# Altium schematic symbol library FPGA_Xilinx_Virtex7.SchLib: 34 symbols (part 10 of 34)
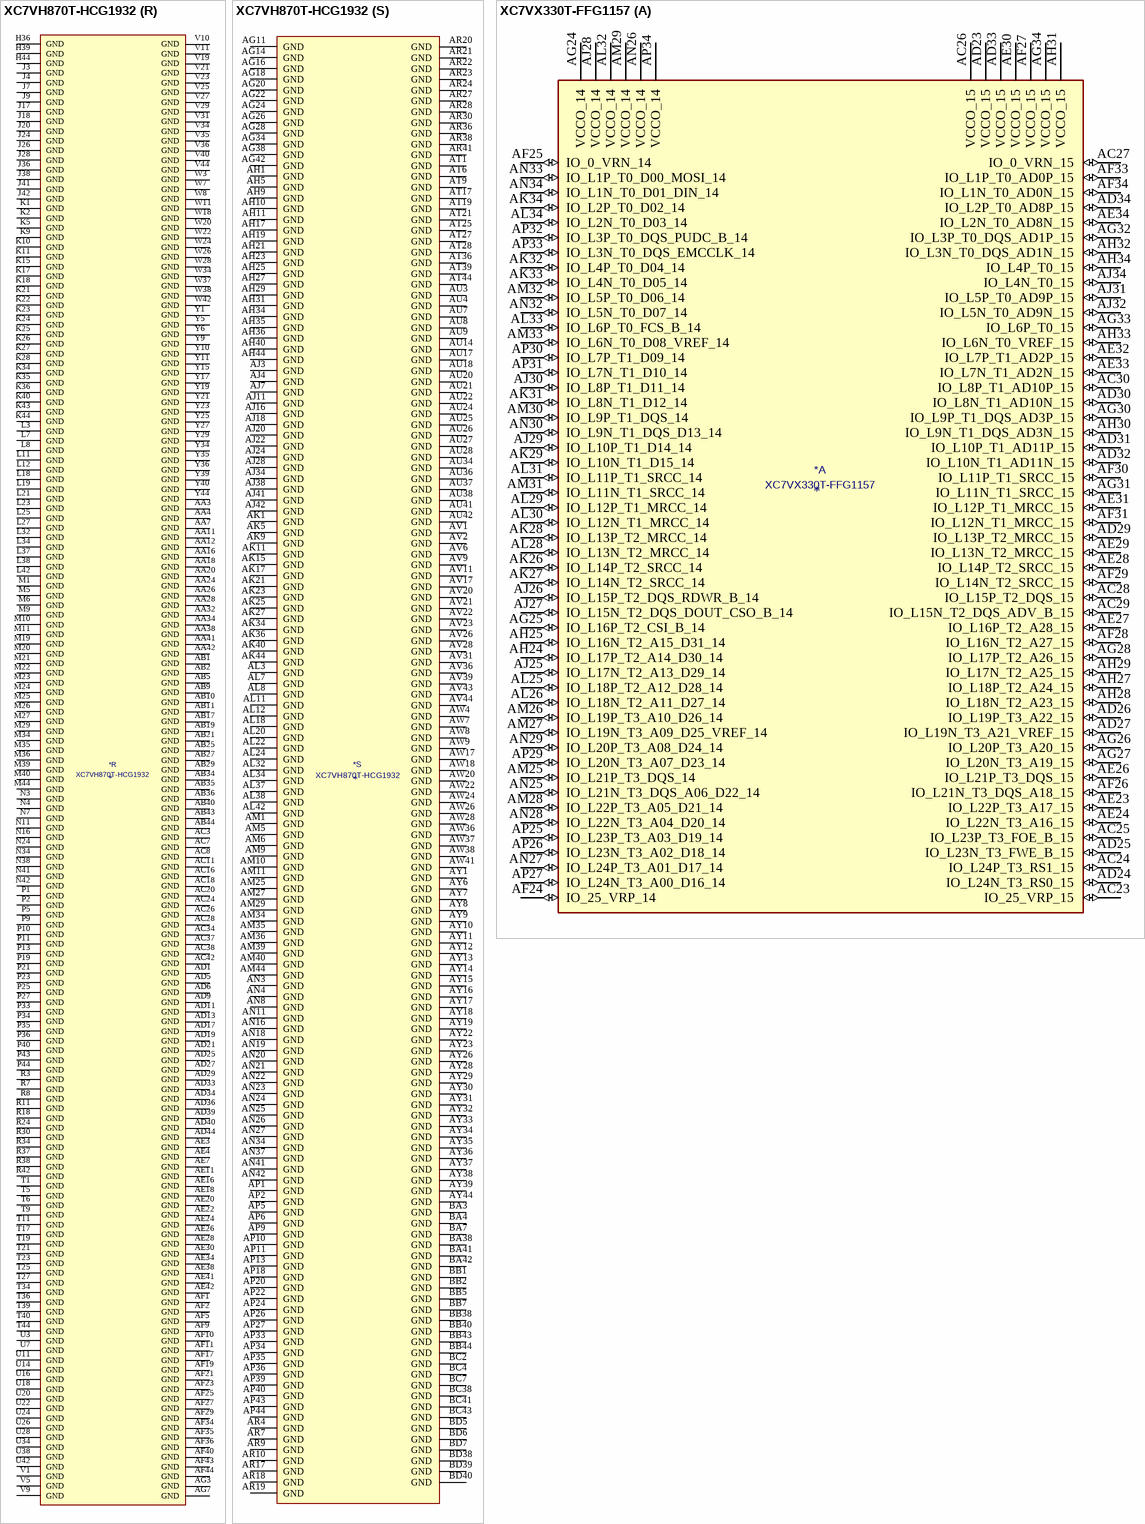
[diagram p181: symbols XC7VH870T-HCG1932 to XC7VX330T-FFG1157]

## XC7VH870T-HCG1932
designator *  value XC7VH870T-HCG1932
ki_keywords: FPGA; ki_description: Virtex 7 HT 870 XC7VH870T-FLG1932
part A pins: AA30 IO_L11P_T1_SRCC_14 (io), AA31 IO_L11N_T1_SRCC_14 (io), AA33 IO_L7P_T1_D09_14 (io), AB30 IO_L12P_T1_MRCC_14 (io), AB31 IO_L12N_T1_MRCC_14 (io), AB32 IO_L9P_T1_DQS_14 (io), AB33 IO_L9N_T1_DQS_D13_14 (io), AC30 IO_L13P_T2_MRCC_14 (io), AC31 VCCO_14 (power), AC32 IO_L17P_T2_A14_D30_14 (io), AC33 IO_L17N_T2_A13_D29_14 (io), AD30 IO_L13N_T2_MRCC_14 (io), AD31 IO_L14P_T2_SRCC_14 (io), AD32 IO_L14N_T2_SRCC_14 (io), AE31 IO_L16P_T2_CSI_B_14 (io), AE32 IO_L16N_T2_A15_D31_14 (io), AE33 IO_L18P_T2_A12_D28_14 (io), AF30 IO_L15P_T2_DQS_RDWR_B_14 (io), AF31 IO_L15N_T2_DQS_DOUT_CSO_B_14 (io), AF32 VCCO_14 (power), AF33 IO_L18N_T2_A11_D27_14 (io), AG30 IO_L20P_T3_A08_D24_14 (io), AG31 IO_L20N_T3_A07_D23_14 (io), AG32 IO_L19P_T3_A10_D26_14 (io), AG33 IO_L19N_T3_A09_D25_VREF_14 (io), AH30 IO_L23P_T3_A03_D19_14 (io), AH32 IO_L24P_T3_A01_D17_14 (io), AH33 IO_L24N_T3_A00_D16_14 (io), AJ29 IO_25_VRP_14 (io), AJ30 IO_L23N_T3_A02_D18_14 (io), AJ31 IO_L21P_T3_DQS_14 (io), AJ32 IO_L21N_T3_DQS_A06_D22_14 (io), AJ33 VCCO_14 (power), AK28 IO_L16P_T2_13 (io), AK29 IO_L18P_T2_13 (io), AK30 VCCO_13 (power), AK31 IO_L3P_T0_DQS_13 (io), AK32 IO_L22P_T3_A05_D21_14 (io), AK33 IO_L22N_T3_A04_D20_14 (io), AL28 IO_L16N_T2_13 (io), AL29 IO_L18N_T2_13 (io), AL30 IO_L15P_T2_DQS_13 (io), AL31 IO_L3N_T0_DQS_13 (io), AL33 IO_L1P_T0_13 (io), AM28 IO_L17P_T2_13 (io), AM30 IO_L15N_T2_DQS_13 (io), AM31 IO_L5P_T0_13 (io), AM32 IO_L5N_T0_13 (io), AM33 IO_L1N_T0_13 (io), AN28 IO_L17N_T2_13 (io), AN29 IO_L14P_T2_SRCC_13 (io), AN30 IO_L14N_T2_SRCC_13 (io), AN31 VCCO_13 (power), AN32 IO_L4P_T0_13 (io), AN33 IO_L4N_T0_13 (io), AP28 VCCO_13 (power), AP29 IO_L13P_T2_MRCC_13 (io), AP30 IO_L13N_T2_MRCC_13 (io), AP31 IO_L11P_T1_SRCC_13 (io), AP32 IO_L6P_T0_13 (io), AR29 IO_L20P_T3_13 (io), AR31 IO_L11N_T1_SRCC_13 (io), AR32 IO_L6N_T0_VREF_13 (io), AR33 IO_L2P_T0_13 (io), AR34 IO_L2N_T0_13 (io), AR35 VCCO_13 (power), AT29 IO_L20N_T3_13 (io), AT30 IO_L24P_T3_13 (io), AT31 IO_L12P_T1_MRCC_13 (io), AT32 VCCO_13 (power), AT33 IO_L9P_T1_DQS_13 (io), AT34 IO_L9N_T1_DQS_13 (io), AT35 IO_L8P_T1_13 (io), AU29 VCCO_13 (power), AU30 IO_L24N_T3_13 (io), AU31 IO_L12N_T1_MRCC_13 (io), AU32 IO_L7P_T1_13 (io), AU33 IO_L7N_T1_13 (io), AU35 IO_L8N_T1_13 (io), AV29 IO_L22P_T3_13 (io), AV30 IO_L22N_T3_13 (io), AV32 IO_L19P_T3_13 (io), AV33 IO_L21P_T3_DQS_13 (io), AV34 IO_L21N_T3_DQS_13 (io), AV35 IO_L10P_T1_13 (io), AW29 IO_25_VRP_13 (io), AW30 IO_L23P_T3_13 (io), AW31 IO_L23N_T3_13 (io), AW32 IO_L19N_T3_VREF_13 (io), AW33 VCCO_13 (power), AW34 IO_0_VRN_13 (io), AW35 IO_L10N_T1_13 (io), R33 IO_L1N_T0_D01_DIN_14 (io), T29 IO_0_VRN_14 (io), T30 IO_L4N_T0_D05_14 (io), T31 IO_L2N_T0_D03_14 (io), T32 VCCO_14 (power), T33 IO_L1P_T0_D00_MOSI_14 (io), U30 IO_L4P_T0_D04_14 (io), U31 IO_L2P_T0_D02_14 (io), U32 IO_L6N_T0_D08_VREF_14 (io), U33 IO_L5N_T0_D07_14 (io), V30 IO_L3N_T0_DQS_EMCCLK_14 (io), V32 IO_L6P_T0_FCS_B_14 (io), V33 IO_L5P_T0_D06_14 (io), W30 IO_L3P_T0_DQS_PUDC_B_14 (io), W31 IO_L8N_T1_D12_14 (io), W32 IO_L10N_T1_D15_14 (io), W33 VCCO_14 (power), Y30 VCCO_14 (power), Y31 IO_L8P_T1_D11_14 (io), Y32 IO_L10P_T1_D14_14 (io), Y33 IO_L7N_T1_D10_14 (io)
part B pins: AK13 IO_L1P_T0_33 (io), AK14 IO_L3P_T0_DQS_33 (io), AK16 IO_L18P_T2_33 (io), AL13 IO_L1N_T0_33 (io), AL14 IO_L3N_T0_DQS_33 (io), AL15 IO_L15P_T2_DQS_33 (io), AL16 IO_L18N_T2_33 (io), AL17 VCCO_33 (power), AM12 IO_L5N_T0_33 (io), AM13 IO_L5P_T0_33 (io), AM14 VCCO_33 (power), AM15 IO_L15N_T2_DQS_33 (io), AM16 IO_L16N_T2_33 (io), AM17 IO_L16P_T2_33 (io), AN12 IO_L4N_T0_33 (io), AN13 IO_L4P_T0_33 (io), AN14 IO_L14N_T2_SRCC_33 (io), AN15 IO_L14P_T2_SRCC_33 (io), AN17 IO_L17P_T2_33 (io), AP12 IO_L6N_T0_VREF_33 (io), AP14 IO_L11P_T1_SRCC_33 (io), AP15 IO_L13N_T2_MRCC_33 (io), AP16 IO_L13P_T2_MRCC_33 (io), AP17 IO_L17N_T2_33 (io), AR11 IO_L2N_T0_33 (io), AR12 IO_L2P_T0_33 (io), AR13 IO_L6P_T0_33 (io), AR14 IO_L11N_T1_SRCC_33 (io), AR15 VCCO_33 (power), AR16 IO_L20P_T3_33 (io), AT10 IO_L8P_T1_33 (io), AT11 IO_L9P_T1_DQS_33 (io), AT12 VCCO_33 (power), AT13 IO_L12N_T1_MRCC_33 (io), AT14 IO_L12P_T1_MRCC_33 (io), AT15 IO_L24P_T3_33 (io), AT16 IO_L20N_T3_33 (io), AU10 IO_L8N_T1_33 (io), AU11 IO_L9N_T1_DQS_33 (io), AU12 IO_L7N_T1_33 (io), AU13 IO_L7P_T1_33 (io), AU15 IO_L24N_T3_33 (io), AU16 IO_25_VRP_33 (io), AV10 IO_L10P_T1_33 (io), AV12 IO_L19N_T3_VREF_33 (io), AV13 IO_L19P_T3_33 (io), AV14 IO_L22N_T3_33 (io), AV15 IO_L22P_T3_33 (io), AV16 VCCO_33 (power), AW10 IO_L10N_T1_33 (io), AW11 IO_L21N_T3_DQS_33 (io), AW12 IO_L21P_T3_DQS_33 (io), AW13 VCCO_33 (power), AW14 IO_0_VRN_33 (io), AW15 IO_L23N_T3_33 (io), AW16 IO_L23P_T3_33 (io), F29 IO_L8P_T1_AD10P_15 (io), F30 IO_L8N_T1_AD10N_15 (io), F31 IO_L9N_T1_DQS_AD3N_15 (io), F32 VCCO_15 (power), F33 IO_L10P_T1_AD11P_15 (io), F34 IO_L10N_T1_AD11N_15 (io), F35 IO_0_VRN_15 (io), G29 VCCO_15 (power), G30 IO_L6N_T0_VREF_15 (io), G31 IO_L9P_T1_DQS_AD3P_15 (io), G32 IO_L12N_T1_MRCC_15 (io), G33 IO_L7N_T1_AD2N_15 (io), G35 IO_L21N_T3_DQS_A18_15 (io), H29 IO_L6P_T0_15 (io), H30 IO_L18N_T2_A23_15 (io), H32 IO_L12P_T1_MRCC_15 (io), H33 IO_L7P_T1_AD2P_15 (io), H34 IO_L21P_T3_DQS_15 (io), H35 IO_L19N_T3_A21_VREF_15 (io), J29 IO_L4N_T0_15 (io), J30 IO_L18P_T2_A24_15 (io), J31 IO_L17N_T2_A25_15 (io), J32 IO_L11N_T1_SRCC_15 (io), J33 VCCO_15 (power), J34 IO_L24N_T3_RS0_15 (io), J35 IO_L19P_T3_A22_15 (io), K29 IO_L4P_T0_15 (io), K30 VCCO_15 (power), K31 IO_L17P_T2_A26_15 (io), K32 IO_L11P_T1_SRCC_15 (io), K33 IO_L24P_T3_RS1_15 (io), L28 IO_L1P_T0_AD0P_15 (io), L29 IO_L1N_T0_AD0N_15 (io), L30 IO_L14N_T2_SRCC_15 (io), L31 IO_L13N_T2_MRCC_15 (io), L33 IO_25_VRP_15 (io), M28 IO_L3N_T0_DQS_AD1N_15 (io), M30 IO_L14P_T2_SRCC_15 (io), M31 IO_L13P_T2_MRCC_15 (io), M32 IO_L22N_T3_A16_15 (io), M33 IO_L23N_T3_FWE_B_15 (io), N28 IO_L3P_T0_DQS_AD1P_15 (io), N29 IO_L5N_T0_AD9N_15 (io), N30 IO_L15N_T2_DQS_ADV_B_15 (io), N31 VCCO_15 (power), N32 IO_L22P_T3_A17_15 (io), N33 IO_L23P_T3_FOE_B_15 (io), P28 VCCO_15 (power), P29 IO_L5P_T0_AD9P_15 (io), P30 IO_L15P_T2_DQS_15 (io), P31 IO_L16N_T2_A27_15 (io), P32 IO_L20N_T3_A19_15 (io), R28 IO_L2P_T0_AD8P_15 (io), R29 IO_L2N_T0_AD8N_15 (io), R31 IO_L16P_T2_A28_15 (io), R32 IO_L20P_T3_A20_15 (io)
part C pins: AA13 IO_L9P_T1_DQS_34 (io), AA14 IO_L11N_T1_SRCC_34 (io), AA15 IO_L11P_T1_SRCC_34 (io), AB12 IO_L17N_T2_34 (io), AB13 IO_L17P_T2_34 (io), AB14 VCCO_34 (power), AB15 IO_L12P_T1_MRCC_34 (io), AC12 IO_L16P_T2_34 (io), AC13 IO_L14N_T2_SRCC_34 (io), AC14 IO_L14P_T2_SRCC_34 (io), AC15 IO_L12N_T1_MRCC_34 (io), AD12 IO_L16N_T2_34 (io), AD14 IO_L13N_T2_MRCC_34 (io), AD15 IO_L13P_T2_MRCC_34 (io), AE12 IO_L18N_T2_34 (io), AE13 IO_L18P_T2_34 (io), AE14 IO_L15P_T2_DQS_34 (io), AE15 VCCO_34 (power), AF12 VCCO_34 (power), AF13 IO_L19P_T3_34 (io), AF14 IO_L15N_T2_DQS_34 (io), AF15 IO_L20P_T3_34 (io), AG12 IO_L24P_T3_34 (io), AG13 IO_L19N_T3_VREF_34 (io), AG15 IO_L20N_T3_34 (io), AH12 IO_L24N_T3_34 (io), AH13 IO_L21N_T3_DQS_34 (io), AH14 IO_L21P_T3_DQS_34 (io), AH15 IO_L23P_T3_34 (io), AJ12 IO_L22P_T3_34 (io), AJ13 VCCO_34 (power), AJ14 IO_25_VRP_34 (io), AJ15 IO_L23N_T3_34 (io), AK12 IO_L22N_T3_34 (io), F10 IO_0_VRN_35 (io), F11 IO_L19N_T3_VREF_35 (io), F12 VCCO_35 (power), F13 IO_L10N_T1_AD15N_35 (io), F14 IO_L10P_T1_AD15P_35 (io), F15 IO_L9N_T1_DQS_AD7N_35 (io), F16 IO_L9P_T1_DQS_AD7P_35 (io), G10 IO_L24N_T3_35 (io), G11 IO_L19P_T3_35 (io), G12 IO_L7N_T1_AD6N_35 (io), G13 IO_L7P_T1_AD6P_35 (io), G15 IO_L18N_T2_35 (io), G16 IO_L18P_T2_35 (io), H10 IO_L24P_T3_35 (io), H12 IO_L8N_T1_AD14N_35 (io), H13 IO_L8P_T1_AD14P_35 (io), H14 IO_L12N_T1_MRCC_35 (io), H15 IO_L17N_T2_35 (io), H16 VCCO_35 (power), J10 IO_L21N_T3_DQS_35 (io), J11 IO_L21P_T3_DQS_35 (io), J12 IO_L23N_T3_35 (io), J13 VCCO_35 (power), J14 IO_L12P_T1_MRCC_35 (io), J15 IO_L17P_T2_35 (io), J16 IO_L4N_T0_35 (io), K12 IO_L23P_T3_35 (io), K13 IO_L11N_T1_SRCC_35 (io), K14 IO_L13N_T2_MRCC_35 (io), K16 IO_L4P_T0_35 (io), L13 IO_L11P_T1_SRCC_35 (io), L14 IO_L13P_T2_MRCC_35 (io), L15 IO_L14N_T2_SRCC_35 (io), L16 IO_L6N_T0_VREF_35 (io), L17 VCCO_35 (power), M12 IO_L22N_T3_35 (io), M13 IO_L20N_T3_35 (io), M14 VCCO_35 (power), M15 IO_L14P_T2_SRCC_35 (io), M16 IO_L6P_T0_35 (io), M17 IO_L1N_T0_AD4N_35 (io), M18 IO_L3N_T0_DQS_AD5N_35 (io), N12 IO_L22P_T3_35 (io), N13 IO_L20P_T3_35 (io), N14 IO_L16N_T2_35 (io), N15 IO_L15N_T2_DQS_35 (io), N17 IO_L1P_T0_AD4P_35 (io), N18 IO_L3P_T0_DQS_AD5P_35 (io), P12 IO_25_VRP_35 (io), P14 IO_L16P_T2_35 (io), P15 IO_L15P_T2_DQS_35 (io), P16 IO_L5N_T0_AD13N_35 (io), P17 IO_L5P_T0_AD13P_35 (io), P18 VCCO_35 (power), R12 IO_L1N_T0_34 (io), R13 IO_L1P_T0_34 (io), R14 IO_L2N_T0_34 (io), R15 VCCO_35 (power), R16 IO_L2N_T0_AD12N_35 (io), R17 IO_L2P_T0_AD12P_35 (io), T12 VCCO_34 (power), T13 IO_L6N_T0_VREF_34 (io), T14 IO_L2P_T0_34 (io), T15 IO_L4N_T0_34 (io), T16 IO_0_VRN_34 (io), U12 IO_L5N_T0_34 (io), U13 IO_L6P_T0_34 (io), U15 IO_L4P_T0_34 (io), V12 IO_L5P_T0_34 (io), V13 IO_L10N_T1_34 (io), V14 IO_L10P_T1_34 (io), V15 IO_L3N_T0_DQS_34 (io), W12 IO_L7N_T1_34 (io), W13 VCCO_34 (power), W14 IO_L8N_T1_34 (io), W15 IO_L3P_T0_DQS_34 (io), Y12 IO_L7P_T1_34 (io), Y13 IO_L9N_T1_DQS_34 (io), Y14 IO_L8P_T1_34 (io)
part D pins: AM7 MGTREFCLK0N_111 (io), AM8 MGTREFCLK0P_111 (io), AN1 MGTHTXN3_111 (io), AN2 MGTHTXP3_111 (io), AN9 MGTREFCLK1N_111 (io), AN10 MGTREFCLK1P_111 (io), AP3 MGTHTXN2_111 (io), AP4 MGTHTXP2_111 (io), AP7 MGTREFCLK0N_110 (io), AP8 MGTREFCLK0P_110 (io), AR1 MGTHTXN1_111 (io), AR2 MGTHTXP1_111 (io), AR5 MGTHRXN3_111 (io), AR6 MGTHRXP3_111 (io), AT3 MGTHRXN2_111 (io), AT4 MGTHRXP2_111 (io), AT7 MGTREFCLK1N_110 (io), AT8 MGTREFCLK1P_110 (io), AU1 MGTHTXN0_111 (io), AU2 MGTHTXP0_111 (io), AU5 MGTHRXN1_111 (io), AU6 MGTHRXP1_111 (io), AV3 MGTHRXN0_111 (io), AV4 MGTHRXP0_111 (io), AW1 MGTHTXN3_110 (io), AW2 MGTHTXP3_110 (io), AW5 MGTHRXN3_110 (io), AW6 MGTHRXP3_110 (io), AY3 MGTHRXN2_110 (io), AY4 MGTHRXP2_110 (io), BA1 MGTHTXN2_110 (io), BA2 MGTHTXP2_110 (io), BA5 MGTHRXN1_110 (io), BA6 MGTHRXP1_110 (io), BB3 MGTHTXN1_110 (io), BB4 MGTHTXP1_110 (io), BC5 MGTHRXN0_110 (io), BC6 MGTHRXP0_110 (io), BD3 MGTHTXN0_110 (io), BD4 MGTHTXP0_110 (io)
part E pins: AD7 MGTHRXN3_113 (io), AD8 MGTHRXP3_113 (io), AE1 MGTHTXN3_113 (io), AE2 MGTHTXP3_113 (io), AE5 MGTHRXN2_113 (io), AE6 MGTHRXP2_113 (io), AF3 MGTHTXN2_113 (io), AF4 MGTHTXP2_113 (io), AF7 MGTHRXN1_113 (io), AF8 MGTHRXP1_113 (io), AG1 MGTHTXN1_113 (io), AG2 MGTHTXP1_113 (io), AG5 MGTHRXN0_113 (io), AG6 MGTHRXP0_113 (io), AG9 MGTREFCLK0N_113 (io), AG10 MGTREFCLK0P_113 (io), AH3 MGTHTXN0_113 (io), AH4 MGTHTXP0_113 (io), AH7 MGTHRXN3_112 (io), AH8 MGTHRXP3_112 (io), AJ1 MGTHTXN3_112 (io), AJ2 MGTHTXP3_112 (io), AJ5 MGTHRXN2_112 (io), AJ6 MGTHRXP2_112 (io), AJ9 MGTREFCLK1N_113 (io), AJ10 MGTREFCLK1P_113 (io), AK3 MGTHTXN2_112 (io), AK4 MGTHTXP2_112 (io), AK7 MGTREFCLK0N_112 (io), AK8 MGTREFCLK0P_112 (io), AL1 MGTHTXN1_112 (io), AL2 MGTHTXP1_112 (io), AL5 MGTHRXN1_112 (io), AL6 MGTHRXP1_112 (io), AL9 MGTREFCLK1N_112 (io), AL10 MGTREFCLK1P_112 (io), AM3 MGTHTXN0_112 (io), AM4 MGTHTXP0_112 (io), AN5 MGTHRXN0_112 (io), AN6 MGTHRXP0_112 (io)
part F pins: AA1 MGTHTXN3_114 (io), AA2 MGTHTXP3_114 (io), AA5 MGTHRXN2_114 (io), AA6 MGTHRXP2_114 (io), AB3 MGTHTXN2_114 (io), AB4 MGTHTXP2_114 (io), AB7 MGTHRXN1_114 (io), AB8 MGTHRXP1_114 (io), AC1 MGTHTXN1_114 (io), AC2 MGTHTXP1_114 (io), AC5 MGTHRXN0_114 (io), AC6 MGTHRXP0_114 (io), AC9 MGTREFCLK0N_114 (io), AC10 MGTREFCLK0P_114 (io), AD3 MGTHTXN0_114 (io), AD4 MGTHTXP0_114 (io), AE9 MGTREFCLK1N_114 (io), AE10 MGTREFCLK1P_114 (io), T7 MGTHRXN3_115 (io), T8 MGTHRXP3_115 (io), U1 MGTHTXN3_115 (io), U2 MGTHTXP3_115 (io), U5 MGTHRXN2_115 (io), U6 MGTHRXP2_115 (io), U9 MGTREFCLK0N_115 (io), U10 MGTREFCLK0P_115 (io), V3 MGTHTXN2_115 (io), V4 MGTHTXP2_115 (io), V7 MGTHRXN1_115 (io), V8 MGTHRXP1_115 (io), W1 MGTHTXN1_115 (io), W2 MGTHTXP1_115 (io), W5 MGTHRXN0_115 (io), W6 MGTHRXP0_115 (io), W9 MGTREFCLK1N_115 (io), W10 MGTREFCLK1P_115 (io), Y3 MGTHTXN0_115 (io), Y4 MGTHTXP0_115 (io), Y7 MGTHRXN3_114 (io), Y8 MGTHRXP3_114 (io)
part G pins: F3 MGTHRXN3_117 (io), F4 MGTHRXP3_117 (io), G5 MGTHRXN2_117 (io), G6 MGTHRXP2_117 (io), H3 MGTHRXN1_117 (io), H4 MGTHRXP1_117 (io), J1 MGTHTXN3_117 (io), J2 MGTHTXP3_117 (io), J5 MGTHRXN0_117 (io), J6 MGTHRXP0_117 (io), K3 MGTHTXN2_117 (io), K4 MGTHTXP2_117 (io), L1 MGTHTXN1_117 (io), L2 MGTHTXP1_117 (io), L5 MGTHRXN3_116 (io), L6 MGTHRXP3_116 (io), L9 MGTREFCLK0N_117 (io), L10 MGTREFCLK0P_117 (io), M3 MGTHTXN0_117 (io), M4 MGTHTXP0_117 (io), M7 MGTREFCLK1N_117 (io), M8 MGTREFCLK1P_117 (io), N1 MGTHTXN3_116 (io), N2 MGTHTXP3_116 (io), N5 MGTHRXN2_116 (io), N6 MGTHRXP2_116 (io), N9 MGTREFCLK0N_116 (io), N10 MGTREFCLK0P_116 (io), P3 MGTHTXN2_116 (io), P4 MGTHTXP2_116 (io), P7 MGTHRXN1_116 (io), P8 MGTHRXP1_116 (io), R1 MGTHTXN1_116 (io), R2 MGTHTXP1_116 (io), R5 MGTHRXN0_116 (io), R6 MGTHRXP0_116 (io), R9 MGTREFCLK1N_116 (io), R10 MGTREFCLK1P_116 (io), T3 MGTHTXN0_116 (io), T4 MGTHTXP0_116 (io)
part H pins: A5 MGTHRXN3_118 (io), A6 MGTHRXP3_118 (io), AP37 MGTREFCLK0P_210 (io), AP38 MGTREFCLK0N_210 (io), AT37 MGTREFCLK1P_210 (io), AT38 MGTREFCLK1N_210 (io), AW39 MGTHRXP3_210 (io), AW40 MGTHRXN3_210 (io), AW43 MGTHTXP3_210 (io), AW44 MGTHTXN3_210 (io), AY41 MGTHRXP2_210 (io), AY42 MGTHRXN2_210 (io), B3 MGTHTXN3_118 (io), B4 MGTHTXP3_118 (io), BA39 MGTHRXP1_210 (io), BA40 MGTHRXN1_210 (io), BA43 MGTHTXP2_210 (io), BA44 MGTHTXN2_210 (io), BB41 MGTHTXP1_210 (io), BB42 MGTHTXN1_210 (io), BC39 MGTHRXP0_210 (io), BC40 MGTHRXN0_210 (io), BD41 MGTHTXP0_210 (io), BD42 MGTHTXN0_210 (io), C1 MGTHTXN2_118 (io), C2 MGTHTXP2_118 (io), C5 MGTHRXN2_118 (io), C6 MGTHRXP2_118 (io), D3 MGTHRXN1_118 (io), D4 MGTHRXP1_118 (io), E1 MGTHTXN1_118 (io), E2 MGTHTXP1_118 (io), E5 MGTHRXN0_118 (io), E6 MGTHRXP0_118 (io), G1 MGTHTXN0_118 (io), G2 MGTHTXP0_118 (io), H7 MGTREFCLK0N_118 (io), H8 MGTREFCLK0P_118 (io), K7 MGTREFCLK1N_118 (io), K8 MGTREFCLK1P_118 (io)
part I pins: AH37 MGTHRXP3_212 (io), AH38 MGTHRXN3_212 (io), AJ39 MGTHRXP2_212 (io), AJ40 MGTHRXN2_212 (io), AJ43 MGTHTXP3_212 (io), AJ44 MGTHTXN3_212 (io), AK37 MGTREFCLK0P_212 (io), AK38 MGTREFCLK0N_212 (io), AK41 MGTHTXP2_212 (io), AK42 MGTHTXN2_212 (io), AL35 MGTREFCLK1P_212 (io), AL36 MGTREFCLK1N_212 (io), AL39 MGTHRXP1_212 (io), AL40 MGTHRXN1_212 (io), AL43 MGTHTXP1_212 (io), AL44 MGTHTXN1_212 (io), AM37 MGTREFCLK0P_211 (io), AM38 MGTREFCLK0N_211 (io), AM41 MGTHTXP0_212 (io), AM42 MGTHTXN0_212 (io), AN35 MGTREFCLK1P_211 (io), AN36 MGTREFCLK1N_211 (io), AN39 MGTHRXP0_212 (io), AN40 MGTHRXN0_212 (io), AN43 MGTHTXP3_211 (io), AN44 MGTHTXN3_211 (io), AP41 MGTHTXP2_211 (io), AP42 MGTHTXN2_211 (io), AR39 MGTHRXP3_211 (io), AR40 MGTHRXN3_211 (io), AR43 MGTHTXP1_211 (io), AR44 MGTHTXN1_211 (io), AT41 MGTHRXP2_211 (io), AT42 MGTHRXN2_211 (io), AU39 MGTHRXP1_211 (io), AU40 MGTHRXN1_211 (io), AU43 MGTHTXP0_211 (io), AU44 MGTHTXN0_211 (io), AV41 MGTHRXP0_211 (io), AV42 MGTHRXN0_211 (io)
part J pins: AA39 MGTHRXP2_214 (io), AA40 MGTHRXN2_214 (io), AA43 MGTHTXP3_214 (io), AA44 MGTHTXN3_214 (io), AB37 MGTHRXP1_214 (io), AB38 MGTHRXN1_214 (io), AB41 MGTHTXP2_214 (io), AB42 MGTHTXN2_214 (io), AC35 MGTREFCLK0P_214 (io), AC36 MGTREFCLK0N_214 (io), AC39 MGTHRXP0_214 (io), AC40 MGTHRXN0_214 (io), AC43 MGTHTXP1_214 (io), AC44 MGTHTXN1_214 (io), AD37 MGTHRXP3_213 (io), AD38 MGTHRXN3_213 (io), AD41 MGTHTXP0_214 (io), AD42 MGTHTXN0_214 (io), AE35 MGTREFCLK1P_214 (io), AE36 MGTREFCLK1N_214 (io), AE39 MGTHRXP2_213 (io), AE40 MGTHRXN2_213 (io), AE43 MGTHTXP3_213 (io), AE44 MGTHTXN3_213 (io), AF37 MGTHRXP1_213 (io), AF38 MGTHRXN1_213 (io), AF41 MGTHTXP2_213 (io), AF42 MGTHTXN2_213 (io), AG35 MGTREFCLK0P_213 (io), AG36 MGTREFCLK0N_213 (io), AG39 MGTHRXP0_213 (io), AG40 MGTHRXN0_213 (io), AG43 MGTHTXP1_213 (io), AG44 MGTHTXN1_213 (io), AH41 MGTHTXP0_213 (io), AH42 MGTHTXN0_213 (io), AJ35 MGTREFCLK1P_213 (io), AJ36 MGTREFCLK1N_213 (io), Y37 MGTHRXP3_214 (io), Y38 MGTHRXN3_214 (io)
part K pins: L39 MGTHRXP3_216 (io), L40 MGTHRXN3_216 (io), N35 MGTREFCLK0P_216 (io), N36 MGTREFCLK0N_216 (io), N39 MGTHRXP2_216 (io), N40 MGTHRXN2_216 (io), N43 MGTHTXP3_216 (io), N44 MGTHTXN3_216 (io), P37 MGTHRXP1_216 (io), P38 MGTHRXN1_216 (io), P41 MGTHTXP2_216 (io), P42 MGTHTXN2_216 (io), R35 MGTREFCLK1P_216 (io), R36 MGTREFCLK1N_216 (io), R39 MGTHRXP0_216 (io), R40 MGTHRXN0_216 (io), R43 MGTHTXP1_216 (io), R44 MGTHTXN1_216 (io), T37 MGTHRXP3_215 (io), T38 MGTHRXN3_215 (io), T41 MGTHTXP0_216 (io), T42 MGTHTXN0_216 (io), U35 MGTREFCLK0P_215 (io), U36 MGTREFCLK0N_215 (io), U39 MGTHRXP2_215 (io), U40 MGTHRXN2_215 (io), U43 MGTHTXP3_215 (io), U44 MGTHTXN3_215 (io), V37 MGTHRXP1_215 (io), V38 MGTHRXN1_215 (io), V41 MGTHTXP2_215 (io), V42 MGTHTXN2_215 (io), W35 MGTREFCLK1P_215 (io), W36 MGTREFCLK1N_215 (io), W39 MGTHRXP0_215 (io), W40 MGTHRXN0_215 (io), W43 MGTHTXP1_215 (io), W44 MGTHTXN1_215 (io), Y41 MGTHTXP0_215 (io), Y42 MGTHTXN0_215 (io)
part L pins: A39 MGTHRXP3_218 (io), A40 MGTHRXN3_218 (io), B41 MGTHTXP3_218 (io), B42 MGTHTXN3_218 (io), C39 MGTHRXP2_218 (io), C40 MGTHRXN2_218 (io), C43 MGTHTXP2_218 (io), C44 MGTHTXN2_218 (io), D41 MGTHRXP1_218 (io), D42 MGTHRXN1_218 (io), E39 MGTHRXP0_218 (io), E40 MGTHRXN0_218 (io), E43 MGTHTXP1_218 (io), E44 MGTHTXN1_218 (io), F41 MGTHRXP3_217 (io), F42 MGTHRXN3_217 (io), G39 MGTHRXP2_217 (io), G40 MGTHRXN2_217 (io), G43 MGTHTXP0_218 (io), G44 MGTHTXN0_218 (io), H37 MGTREFCLK0P_218 (io), H38 MGTREFCLK0N_218 (io), H41 MGTHRXP1_217 (io), H42 MGTHRXN1_217 (io), J39 MGTHRXP0_217 (io), J40 MGTHRXN0_217 (io), J43 MGTHTXP3_217 (io), J44 MGTHTXN3_217 (io), K37 MGTREFCLK1P_218 (io), K38 MGTREFCLK1N_218 (io), K41 MGTHTXP2_217 (io), K42 MGTHTXN2_217 (io), L35 MGTREFCLK0P_217 (io), L36 MGTREFCLK0N_217 (io), L43 MGTHTXP1_217 (io), L44 MGTHTXN1_217 (io), M37 MGTREFCLK1P_217 (io), M38 MGTREFCLK1N_217 (io), M41 MGTHTXP0_217 (io), M42 MGTHTXN0_217 (io)
part M pins: AA8 MGTAVCC_G11 (power), AA9 MGTRREF_115 (power), AA10 MGTAVTTRCAL_115 (power), AA35 MGTAVTTRCAL_215 (power), AA36 MGTRREF_215 (power), AA37 MGTAVCC_G21 (power), AB6 MGTAVCC_G11 (power), AB39 MGTAVCC_G21 (power), AC4 MGTAVTT_G11 (power), AC41 MGTAVTT_G21 (power), AD2 MGTAVTT_G11 (power), AD10 MGTVCCAUX_G11 (power), AD35 MGTVCCAUX_G21 (power), AD43 MGTAVTT_G21 (power), AE8 MGTAVCC_G11 (power), AE37 MGTAVCC_G21 (power), AF6 MGTAVCC_G11 (power), AF39 MGTAVCC_G21 (power), AG4 MGTAVTT_G11 (power), AG8 MGTAVCC_G11 (power), AG37 MGTAVCC_G21 (power), AG41 MGTAVTT_G21 (power), AH2 MGTAVTT_G11 (power), AH6 MGTAVCC_G11 (power), AH39 MGTAVCC_G21 (power), AH43 MGTAVTT_G21 (power), AJ8 MGTAVCC_G10 (power), AJ37 MGTAVCC_G20 (power), AK2 MGTAVTT_G10 (power), AK6 MGTAVCC_G10 (power), AK10 MGTVCCAUX_G10 (power), AK35 MGTVCCAUX_G20 (power), AK39 MGTAVCC_G20 (power), AK43 MGTAVTT_G20 (power), AL4 MGTAVTT_G10 (power), AL41 MGTAVTT_G20 (power), AM2 MGTAVTT_G10 (power), AM43 MGTAVTT_G20 (power), AN7 MGTAVCC_G10 (power), AN38 MGTAVCC_G20 (power), AR3 MGTAVTT_G10 (power), AR8 MGTAVCC_G10 (power), AR37 MGTAVCC_G20 (power), AR42 MGTAVTT_G20 (power), AT2 MGTAVTT_G10 (power), AT5 MGTAVCC_G10 (power), AT40 MGTAVCC_G20 (power), AT43 MGTAVTT_G20 (power), AV5 MGTAVCC_G10 (power), AV7 MGTRREF_112 (power), AV8 MGTAVTTRCAL_112 (power), AV37 MGTAVTTRCAL_212 (power), AV38 MGTRREF_212 (power), AV40 MGTAVCC_G20 (power), AW3 MGTAVTT_G10 (power), AW42 MGTAVTT_G20 (power), AY2 MGTAVTT_G10 (power), AY5 MGTAVCC_G10 (power), AY40 MGTAVCC_G20 (power), AY43 MGTAVTT_G20 (power), B6 MGTAVCC_G12 (power), B39 MGTAVCC_G22 (power), BB6 MGTAVCC_G10 (power), BB39 MGTAVCC_G20 (power), BC3 MGTAVTT_G10 (power), BC42 MGTAVTT_G20 (power), C3 MGTAVTT_G12 (power), C42 MGTAVTT_G22 (power), D2 MGTAVTT_G12 (power), D5 MGTAVCC_G12 (power), D40 MGTAVCC_G22 (power), D43 MGTAVTT_G22 (power), F5 MGTAVCC_G12 (power), F7 MGTRREF_118 (power), F8 MGTAVTTRCAL_118 (power), F37 MGTAVTTRCAL_218 (power), F38 MGTRREF_218 (power), F40 MGTAVCC_G22 (power), G3 MGTAVTT_G12 (power), G42 MGTAVTT_G22 (power), H2 MGTAVTT_G12 (power), H5 MGTAVCC_G12 (power), H40 MGTAVCC_G22 (power), H43 MGTAVTT_G22 (power), J8 MGTAVCC_G12 (power), J37 MGTAVCC_G22 (power), K6 MGTAVCC_G12 (power), K39 MGTAVCC_G22 (power), L4 MGTAVTT_G12 (power), L41 MGTAVTT_G22 (power), M2 MGTAVTT_G12 (power), M43 MGTAVTT_G22 (power), N8 MGTAVCC_G12 (power), N37 MGTAVCC_G22 (power), P6 MGTAVCC_G12 (power), P39 MGTAVCC_G22 (power), R4 MGTAVTT_G12 (power), R41 MGTAVTT_G22 (power), T2 MGTAVTT_G12 (power), T10 MGTVCCAUX_G12 (power), T35 MGTVCCAUX_G22 (power), T43 MGTAVTT_G22 (power), U4 MGTAVTT_G11 (power), U8 MGTAVCC_G11 (power), U37 MGTAVCC_G21 (power), U41 MGTAVTT_G21 (power), V2 MGTAVTT_G11 (power), V6 MGTAVCC_G11 (power), V39 MGTAVCC_G21 (power), V43 MGTAVTT_G21 (power), W4 MGTAVTT_G11 (power), W41 MGTAVTT_G21 (power), Y2 MGTAVTT_G11 (power), Y43 MGTAVTT_G21 (power)
part N pins: A9 MGTZRXN7_300 (io), A10 MGTZRXP7_300 (io), A12 MGTZRXN5_300 (io), A13 MGTZRXP5_300 (io), A16 MGTZTXN7_300 (io), A17 MGTZTXP7_300 (io), A19 MGTZTXN5_300 (io), A20 MGTZTXP5_300 (io), A24 MGTZRXN3_300 (io), A25 MGTZRXP3_300 (io), A27 MGTZRXN1_300 (io), A28 MGTZRXP1_300 (io), A31 MGTZTXN3_300 (io), A32 MGTZTXP3_300 (io), A34 MGTZTXN1_300 (io), A35 MGTZTXP1_300 (io), AT23 MGTZ_OBS_CLK_P_400 (io), AU23 MGTZ_OBS_CLK_N_400 (io), AV24 MGTZ_THERM_IN_400 (io), AV25 MGTZ_THERM_OUT_400 (io), AY20 MGTZREFCLK1P_400 (io), AY21 MGTZREFCLK1N_400 (io), AY24 MGTZREFCLK0P_400 (io), AY25 MGTZREFCLK0N_400 (io), BB9 MGTZTXP0_400 (io), BB10 MGTZTXN0_400 (io), BB12 MGTZTXP2_400 (io), BB13 MGTZTXN2_400 (io), BB16 MGTZRXP0_400 (io), BB17 MGTZRXN0_400 (io), BB19 MGTZRXP2_400 (io), BB20 MGTZRXN2_400 (io), BB24 MGTZTXP4_400 (io), BB25 MGTZTXN4_400 (io), BB27 MGTZTXP6_400 (io), BB28 MGTZTXN6_400 (io), BB31 MGTZRXP4_400 (io), BB32 MGTZRXN4_400 (io), BB34 MGTZRXP6_400 (io), BB35 MGTZRXN6_400 (io), BD10 MGTZTXP1_400 (io), BD11 MGTZTXN1_400 (io), BD13 MGTZTXP3_400 (io), BD14 MGTZTXN3_400 (io), BD17 MGTZRXP1_400 (io), BD18 MGTZRXN1_400 (io), BD20 MGTZRXP3_400 (io), BD21 MGTZRXN3_400 (io), BD25 MGTZTXP5_400 (io), BD26 MGTZTXN5_400 (io), BD28 MGTZTXP7_400 (io), BD29 MGTZTXN7_400 (io), BD32 MGTZRXP5_400 (io), BD33 MGTZRXN5_400 (io), BD35 MGTZRXP7_400 (io), BD36 MGTZRXN7_400 (io), C10 MGTZRXN6_300 (io), C11 MGTZRXP6_300 (io), C13 MGTZRXN4_300 (io), C14 MGTZRXP4_300 (io), C17 MGTZTXN6_300 (io), C18 MGTZTXP6_300 (io), C20 MGTZTXN4_300 (io), C21 MGTZTXP4_300 (io), C25 MGTZRXN2_300 (io), C26 MGTZRXP2_300 (io), C28 MGTZRXN0_300 (io), C29 MGTZRXP0_300 (io), C32 MGTZTXN2_300 (io), C33 MGTZTXP2_300 (io), C35 MGTZTXN0_300 (io), C36 MGTZTXP0_300 (io), E20 MGTZREFCLK0N_300 (io), E21 MGTZREFCLK0P_300 (io), E24 MGTZREFCLK1N_300 (io), E25 MGTZREFCLK1P_300 (io), G20 MGTZ_THERM_OUT_300 (io), G21 MGTZ_THERM_IN_300 (io), H22 MGTZ_OBS_CLK_N_300 (io), J22 MGTZ_OBS_CLK_P_300 (io)
part O pins: A8 MGTZAGND_300 (power), A11 MGTZAGND_300 (power), A14 MGTZAGND_300 (power), A15 MGTZAGND_300 (power), A18 MGTZAGND_300 (power), A21 MGTZAGND_300 (power), A22 MGTZAGND_300 (power), A23 MGTZAGND_300 (power), A26 MGTZAGND_300 (power), A29 MGTZAGND_300 (power), A30 MGTZAGND_300 (power), A33 MGTZAGND_300 (power), A36 MGTZAGND_300 (power), A37 MGTZAGND_300 (power), AP19 MGTZVCCL_400 (power), AP21 MGTZVCCL_400 (power), AP23 MGTZVCCL_400 (power), AP25 MGTZVCCL_400 (power), AR25 MGTZ_SENSE_GNDL_400 (power), AR26 MGTZ_SENSE_VCCL_400 (power), AT18 MGTZVCCH_400 (power), AT20 MGTZVCCH_400 (power), AT22 MGTZVCCH_400 (power), AT24 MGTZVCCH_400 (power), AT26 MGTZVCCH_400 (power), AU19 MGTZ_SENSE_VCC_400 (power), AV18 MGTZ_SENSE_VCCH_400 (power), AV19 MGTZ_SENSE_GND_400 (power), AV27 MGTZVCCH_400 (power), AW19 MGTZVCCH_400 (power), AW21 MGTZVCCH_400 (power), AW23 MGTZVCCH_400 (power), AW25 MGTZVCCH_400 (power), AW27 MGTZ_SENSE_AGND_400 (power), AY27 MGTZ_SENSE_AVCC_400 (power), B8 MGTZAGND_300 (power), B9 MGTZAVCC_300 (power), B10 MGTZAGND_300 (power), B11 MGTZAVCC_300 (power), B12 MGTZAGND_300 (power), B13 MGTZAVCC_300 (power), B14 MGTZAGND_300 (power), B15 MGTZAVCC_300 (power), B16 MGTZAGND_300 (power), B17 MGTZAVCC_300 (power), B18 MGTZAGND_300 (power), B19 MGTZAVCC_300 (power), B20 MGTZAGND_300 (power), B21 MGTZAVCC_300 (power), B22 MGTZAGND_300 (power), B23 MGTZAVCC_300 (power), B24 MGTZAGND_300 (power), B25 MGTZAVCC_300 (power), B26 MGTZAGND_300 (power), B27 MGTZAVCC_300 (power), B28 MGTZAGND_300 (power), B29 MGTZAVCC_300 (power), B30 MGTZAGND_300 (power), B31 MGTZAVCC_300 (power), B32 MGTZAGND_300 (power), B33 MGTZAVCC_300 (power), B34 MGTZAGND_300 (power), B35 MGTZAVCC_300 (power), B36 MGTZAGND_300 (power), B37 MGTZAVCC_300 (power), BA8 MGTZAGND_400 (power), BA9 MGTZAGND_400 (power), BA10 MGTZAGND_400 (power), BA11 MGTZAGND_400 (power), BA12 MGTZAGND_400 (power), BA13 MGTZAGND_400 (power), BA14 MGTZAGND_400 (power), BA15 MGTZAGND_400 (power), BA16 MGTZAGND_400 (power), BA17 MGTZAGND_400 (power), BA18 MGTZAGND_400 (power), BA19 MGTZAGND_400 (power), BA20 MGTZAGND_400 (power), BA21 MGTZAGND_400 (power), BA22 MGTZAGND_400 (power), BA23 MGTZAGND_400 (power), BA24 MGTZAGND_400 (power), BA25 MGTZAGND_400 (power), BA26 MGTZAGND_400 (power), BA27 MGTZAGND_400 (power), BA28 MGTZAGND_400 (power), BA29 MGTZAGND_400 (power), BA30 MGTZAGND_400 (power), BA31 MGTZAGND_400 (power), BA32 MGTZAGND_400 (power), BA33 MGTZAGND_400 (power), BA34 MGTZAGND_400 (power), BA35 MGTZAGND_400 (power), BA36 MGTZAGND_400 (power), BA37 MGTZAGND_400 (power), BB8 MGTZAGND_400 (power), BB11 MGTZAGND_400 (power), BB14 MGTZAGND_400 (power), BB15 MGTZAGND_400 (power), BB18 MGTZAGND_400 (power), BB21 MGTZAGND_400 (power), BB22 MGTZAGND_400 (power), BB23 MGTZAGND_400 (power), BB26 MGTZAGND_400 (power), BB29 MGTZAGND_400 (power), BB30 MGTZAGND_400 (power), BB33 MGTZAGND_400 (power), BB36 MGTZAGND_400 (power), BB37 MGTZAGND_400 (power), BC8 MGTZAVCC_400 (power), BC9 MGTZAGND_400 (power), BC10 MGTZAVCC_400 (power), BC11 MGTZAGND_400 (power), BC12 MGTZAVCC_400 (power), BC13 MGTZAGND_400 (power), BC14 MGTZAVCC_400 (power), BC15 MGTZAGND_400 (power), BC16 MGTZAVCC_400 (power), BC17 MGTZAGND_400 (power), BC18 MGTZAVCC_400 (power), BC19 MGTZAGND_400 (power), BC20 MGTZAVCC_400 (power), BC21 MGTZAGND_400 (power), BC22 MGTZAVCC_400 (power), BC23 MGTZAGND_400 (power), BC24 MGTZAVCC_400 (power), BC25 MGTZAGND_400 (power), BC26 MGTZAVCC_400 (power), BC27 MGTZAGND_400 (power), BC28 MGTZAVCC_400 (power), BC29 MGTZAGND_400 (power), BC30 MGTZAVCC_400 (power), BC31 MGTZAGND_400 (power), BC32 MGTZAVCC_400 (power), BC33 MGTZAGND_400 (power), BC34 MGTZAVCC_400 (power), BC35 MGTZAGND_400 (power), BC36 MGTZAVCC_400 (power), BC37 MGTZAGND_400 (power), BD8 MGTZAGND_400 (power), BD9 MGTZAGND_400 (power), BD12 MGTZAGND_400 (power), BD15 MGTZAGND_400 (power), BD16 MGTZAGND_400 (power), BD19 MGTZAGND_400 (power), BD22 MGTZAGND_400 (power), BD23 MGTZAGND_400 (power), BD24 MGTZAGND_400 (power), BD27 MGTZAGND_400 (power), BD30 MGTZAGND_400 (power), BD31 MGTZAGND_400 (power), BD34 MGTZAGND_400 (power), BD37 MGTZAGND_400 (power), C8 MGTZAGND_300 (power), C9 MGTZAGND_300 (power), C12 MGTZAGND_300 (power), C15 MGTZAGND_300 (power), C16 MGTZAGND_300 (power), C19 MGTZAGND_300 (power), C22 MGTZAGND_300 (power), C23 MGTZAGND_300 (power), C24 MGTZAGND_300 (power), C27 MGTZAGND_300 (power), C30 MGTZAGND_300 (power), C31 MGTZAGND_300 (power), C34 MGTZAGND_300 (power), C37 MGTZAGND_300 (power), D8 MGTZAGND_300 (power), D9 MGTZAGND_300 (power), D10 MGTZAGND_300 (power), D11 MGTZAGND_300 (power), D12 MGTZAGND_300 (power), D13 MGTZAGND_300 (power), D14 MGTZAGND_300 (power), D15 MGTZAGND_300 (power), D16 MGTZAGND_300 (power), D17 MGTZAGND_300 (power), D18 MGTZAGND_300 (power), D19 MGTZAGND_300 (power), D20 MGTZAGND_300 (power), D21 MGTZAGND_300 (power), D22 MGTZAGND_300 (power), D23 MGTZAGND_300 (power), D24 MGTZAGND_300 (power), D25 MGTZAGND_300 (power), D26 MGTZAGND_300 (power), D27 MGTZAGND_300 (power), D28 MGTZAGND_300 (power), D29 MGTZAGND_300 (power), D30 MGTZAGND_300 (power), D31 MGTZAGND_300 (power), D32 MGTZAGND_300 (power), D33 MGTZAGND_300 (power), D34 MGTZAGND_300 (power), D35 MGTZAGND_300 (power), D36 MGTZAGND_300 (power), D37 MGTZAGND_300 (power), E18 MGTZ_SENSE_AVCC_300 (power), F18 MGTZ_SENSE_AGND_300 (power), F20 MGTZVCCH_300 (power), F22 MGTZVCCH_300 (power), F24 MGTZVCCH_300 (power), F26 MGTZVCCH_300 (power), G18 MGTZVCCH_300 (power), G26 MGTZ_SENSE_GND_300 (power), G27 MGTZ_SENSE_VCCH_300 (power), H26 MGTZ_SENSE_VCC_300 (power), J19 MGTZVCCH_300 (power), J21 MGTZVCCH_300 (power), J23 MGTZVCCH_300 (power), J25 MGTZVCCH_300 (power), J27 MGTZVCCH_300 (power), K19 MGTZ_SENSE_VCCL_300 (power), K20 MGTZ_SENSE_GNDL_300 (power), L20 MGTZVCCL_300 (power), L22 MGTZVCCL_300 (power), L24 MGTZVCCL_300 (power), L26 MGTZVCCL_300 (power)